# Altium footprint library Binh.PcbLib: 863 footprints (part 16 of 54)
Each footprint in its own frame and in the unit in brackets; x right, y up, seen from the top. Pads: shape width x height; smd on the part's side, far side on the other; paste and mask are expansions set on the pad; w line width, h text height; cw(c..) or ccw(c..) is an arc to the next point about the centre after c.
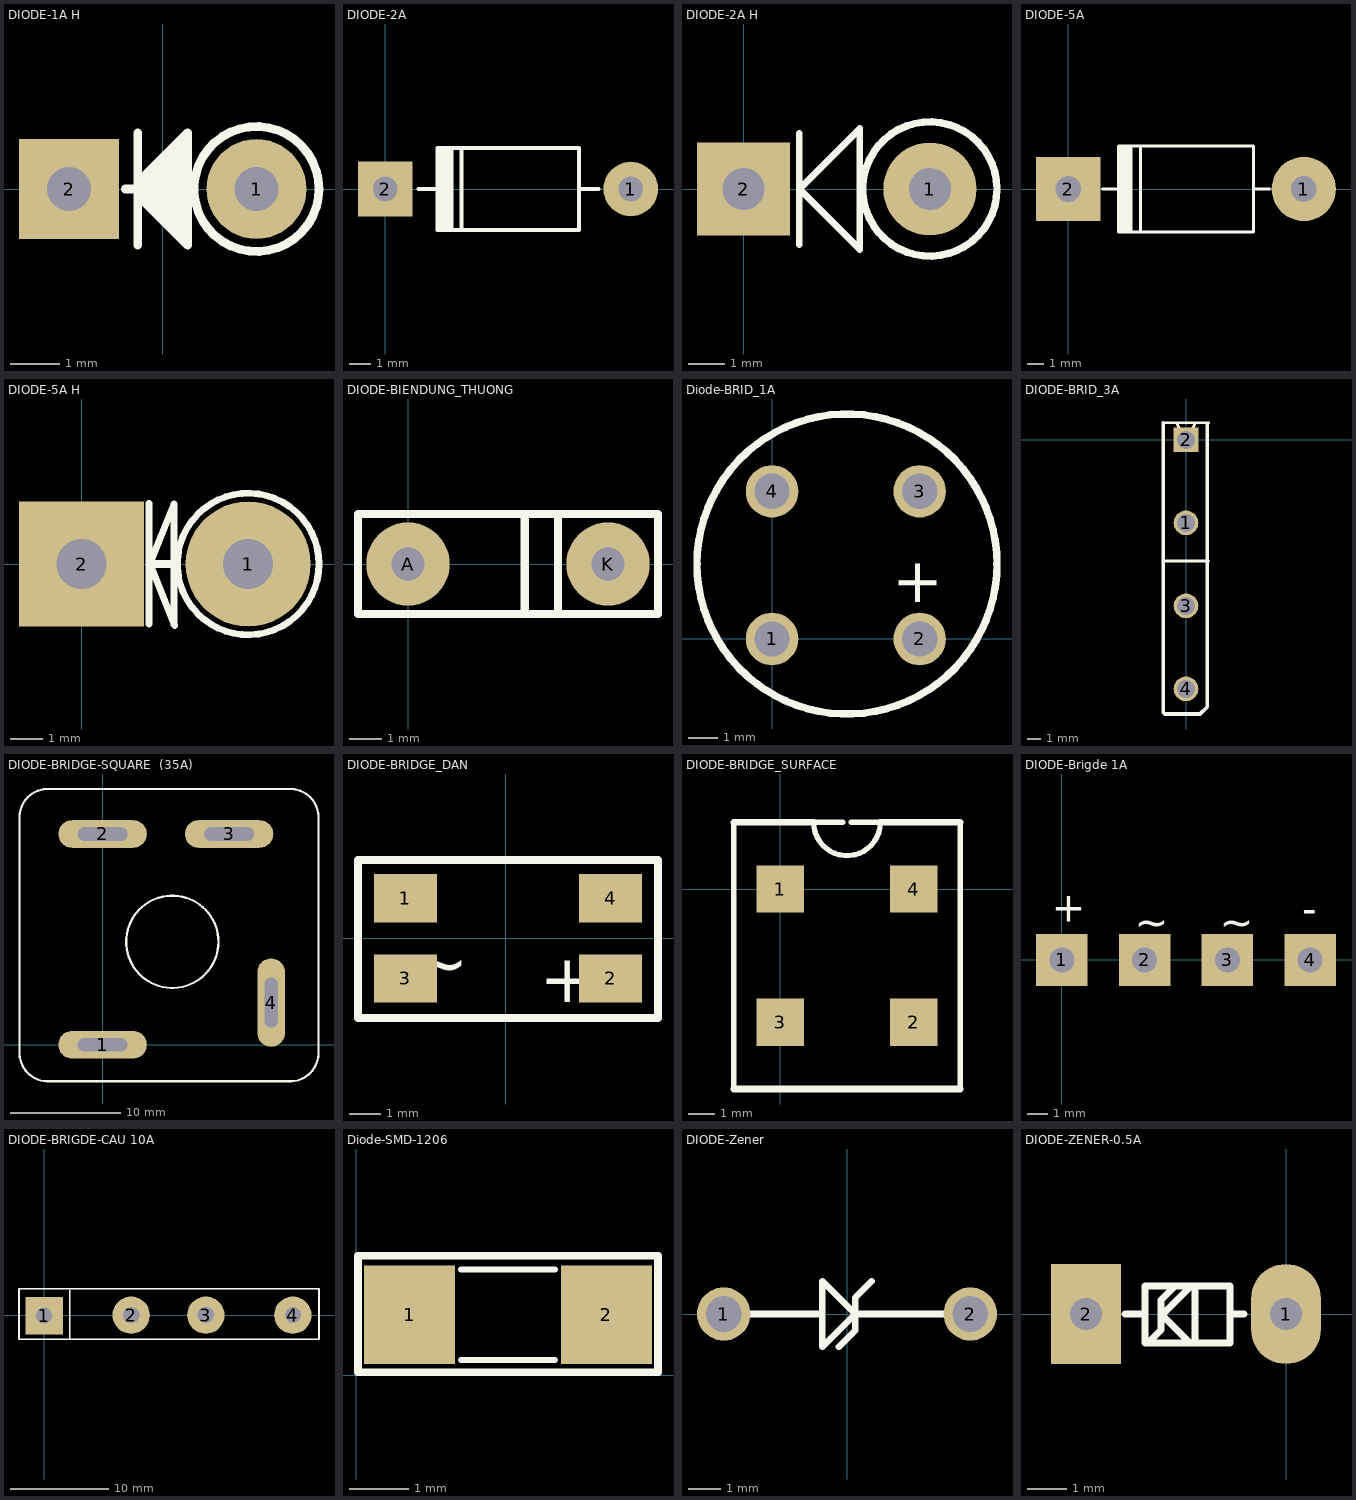
[diagram p15: the footprints below, top view; thin cyan lines are the x and y axes]

## DIODE-1A H [mil] "Diode 1A, W 100mil, L 150mil"
height 100
pads (2):
  round 80 hole 35: 1(75,0)
  rect 80x80 hole 35: 2(-75,0)
Top Overlay:
  circle w7: c75,0 r50
  region: 20,40 20,-40 15,-40 -20,-5 -20,5
  lines w7: -30,0 -20,0 ; -20,-45 -20,45 ; -20,-5 -20,5 20,45 20,-45 -20,-5
3D body "SW3dPS-1N4007_Stand.STEP": height 252.32, standoff -78.14, extent -64,-50 104,55

## DIODE-2A [mil] "Diode 2A, W 150mil, L 450mil"
height 100
pads (2):
  round 100 hole 45: 1(450,0)
  rect 100x100 hole 45: 2(0,0)
Top Overlay:
  rectangle: 95,-75 125,75
  lines w7: 61,0 96,0 ; 96,-31 96,0 ; 96,32 96,0 ; 140,-75 140,75 ; 355,0 391,0 ; 96,-75 96,75 355,75 355,-75 96,-75
3D body "SW3DPS-DIODE0_4.step": height 100.5, standoff -100, extent 5,-47 435,54

## DIODE-2A H [mil] "Diode 2A, W 150mil, L 450mil"
height 100
pads (2):
  round 100 hole 45: 1(200,0)
  rect 100x100 hole 45: 2(0,0)
Top Overlay:
  circle w8: c200,0 r72.11
  lines w7: 60,-60 60,60 ; 125,50 125,65 60,0 125,-65 125,55
3D body "SW3dPS-Zener 1W_Stand.STEP": height 252.32, standoff -78.14, extent 46.01,-49.99 214.01,55

## DIODE-5A [mil] "Diode 5A, W 200mil, L 550mil"
height 150
pads (2):
  round 150 hole 60: 1(550,0)
  rect 150x150 hole 60: 2(0,0)
Top Overlay:
  rectangle: 120,-100 150,100
  lines w7: 80,0 118,0 ; 118,-44 118,0 ; 118,46 118,0 ; 169,-99 169,100 ; 432,0 470,0 ; 118,-100 432,-100 432,100 118,100 118,-100
3D body "User Library-BYW98.step": height 254.33, standoff -86.22, extent -51.87,-106 589.87,102.66

## DIODE-5A H [mil] "Diode 5A, W 200mil, L 250mil"
height 150
pads (2):
  round 150 hole 60: 1(200,0)
  rect 150x150 hole 60: 2(0,0)
Top Overlay:
  circle w8: c200,0 r85
  lines w8: 81,-72 81,73 ; 82,0 111,72 111,-73 ; 83,-2 112,-74
  lines w10: 82,0 113,0
3D body "SW3dPS-Zener 1W_Stand.STEP": height 252.32, standoff -78.14, extent 21,-73.99 189,31

## DIODE-BIENDUNG_THUONG [mm]
pads (2):
  round 2.54 hole 1: A(0,0) K(6.096,0)
Top Overlay:
  lines w0.254: 3.556,-1.524 3.556,1.524 ; 4.572,-1.524 4.572,1.524 ; -1.524,-1.524 7.62,-1.524 7.62,1.524 -1.524,1.524 -1.524,-1.524

## Diode-BRID_1A [mil]
pads (4):
  round 70 hole 47.24 unplated: 1(0,0) 2(196.85,0) 3(196.85,196.85) 4(0,196.85)
Top Overlay:
  circle w10: c100,100 r200
  text "+" at 220,40 h60

## DIODE-BRID_3A [mil]
pads (4):
  round 70 hole 51.18 unplated: 1(0,-236.22) 3(0,-472.44) 4(0,-708.66)
  rect 70x70 hole 51.18 unplated: 2(0,0)
Top Overlay:
  lines w7.87: -64.37,-344.49 64.37,-344.49 ; -64.37,49.21 24.61,49.21 cw(c0,49.21) -24.61,49.21 64.37,49.21
  lines w10: -64.37,49.21 -64.37,-775.63 -60,-780 40,-780 60,-760 60,44.84

## DIODE-BRIDGE-SQUARE  (35A) [mm]
pads (4):
  oval 8x2.5 hole 1.2 slot 4.5 at 0 deg: 1(0,0) 2(0,19.05) 3(11.43,19.05)
  oval 2.5x8 hole 1.2 slot 4.5 at 90 deg: 4(15.24,3.81)
Top Overlay:
  circle w0.2: c6.303,9.304 r4.17
  lines w0.2: -7.504,-0.6 ccw(c-4.952,-0.75) -4.802,-3.302 16.808,-3.302 ccw(c16.958,-0.75) 19.509,-0.6 19.509,20.41 ccw(c16.958,20.56) 16.808,23.111 -4.802,23.111 ccw(c-4.952,20.56) -7.504,20.41 -7.504,-0.6
3D body "User Library-SquareDiodeBridge-L.step": height 8.05, standoff -11, extent -8.281,-4.217 20.219,24.283

## DIODE-BRIDGE_DAN [mm]
pads (4):
  rect 2x1.524 smd: 1(-3.175,1.27) 2(3.325,-1.27) 3(-3.175,-1.27) 4(3.325,1.27)
Top Overlay:
  lines w0.254: -4.675,-2.52 -4.675,2.48 4.825,2.48 4.825,-2.52 -4.675,-2.52
  text "~" at -2.925,-1.52 h1.52
  text "+" at 1.075,-2.02 h1.52

## DIODE-BRIDGE_SURFACE [mil]
pads (4):
  rect 70x70 smd: 1(0,0) 2(196.85,-196.85) 3(0,-196.85) 4(196.85,0)
Top Overlay:
  lines w7.87: -68.9,-295.28 -68.9,98.43 ; 91.93,98.43 49.21,98.43 ccw(c98.43,98.43) 147.64,98.43 104.92,98.43 ; 265.75,-295.28 265.75,98.43
  lines w10: -68.9,-295.28 265.75,-295.28 ; -68.9,98.43 49.21,98.43 ; 147.64,98.43 265.75,98.43

## DIODE-Brigde 1A [mm]
pads (4):
  rect 2.5x2.5 / inner round 1.575 / far side rect 2.5x2.5 hole 1.2: 1(0,0) 2(4,0) 3(8,0) 4(12,0)
Top Overlay:
  text "~" at 3.531,1.118 h1.43
  text "~" at 7.62,1.13 h1.43
  text "+" at -0.483,1.841 h1.43
  text "-" at 11.608,1.778 h1.43
3D body "SW3dPS-KBPM.STEP": height 10.7, standoff -13.5, extent -1.27,-2.515 13.309,2.495

## DIODE-BRIGDE-CAU 10A [mil] "CAU 10A det"
height 800
pads (4):
  rect 150x150 hole 65: 1(0,-2)
  round 150 hole 65: 2(350,0) 3(650,0) 4(1000,0)
Top Overlay:
  lines w7: 103,-95 103,99 ; -101,-97 -101,104.86 1105,106.36 1105,-97 -101,-97

## Diode-SMD-1206 [mil] "Diode"
pads (2):
  rect 60x65 smd: 1(35,40) 2(165,40)
Top Overlay:
  lines w4: 69,10 131,10 ; 69,70 131,70
  lines w5: 1,2 199,2 199,79 1,79 1,2
3D body "diode  smd 1206.STEP": height 56.1, standoff -0.98, extent 31.1,11.46 168.9,68.55

## DIODE-Zener [mil] "DiodeZener"
pads (2):
  round 65 hole 43.31: 1(-150,0) 2(150,0)
Top Overlay:
  lines w8: -120,0 -30,0 ; -10,-40 10,-20 10,0 ; 30,40 10,20 10,0 ; 120,0 10,0 ; 10,0 -30,40 -30,-40 10,0
3D body "Diode 1N914 (Pitch 280mils).STEP": height 72.37, standoff -110.88, extent -152.12,-31 152.12,35

## DIODE-ZENER-0.5A [mil] "Diode Zenner, W 80mil, L 300mil"
height 80
pads (2):
  oval 70x100 hole 32: 1(0,0)
  rect 70x100 hole 32: 2(-200,0)
Top Overlay:
  lines w7: -161,0 -141,0 ; -138,-29 -125,-16 -125,14 -111.5,27.5 ; -125,-2 -125,0 ; -95,28 -123,0 -125,0 ; -91,28 -91,-27 -89,-29 -93,-29 -96,-29 -125,0 ; -56,0 -42,0 ; -141,-29 -56,-29 -56,28 -141,28 -141,-29